# Altium integrated library Altium_WCAP-ATG8 (rev22a).IntLib: 195 symbols (part 2 of 2)
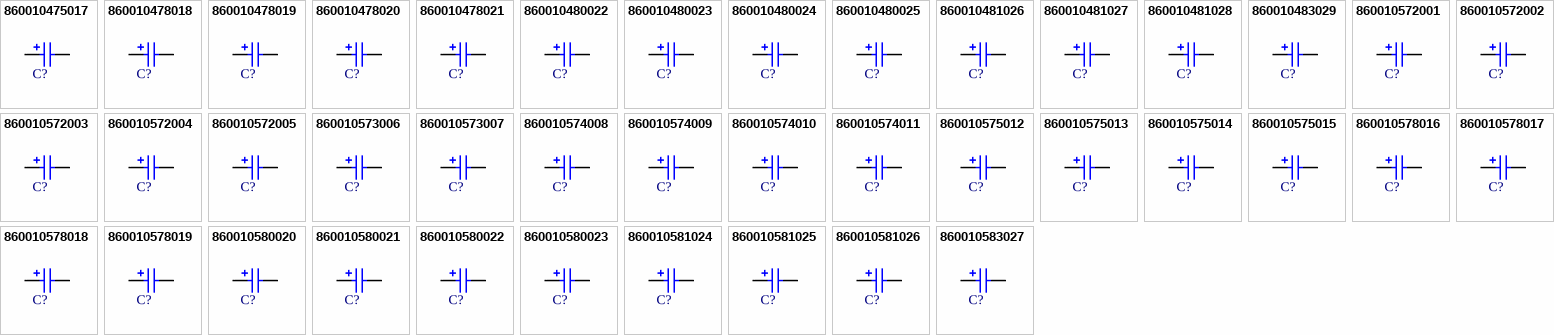
[diagram p5: symbols 860010475017 to 860010583027]

## 860010581024
designator C?, comment 3900uF  (value not drawn)
WCAP-ATG8 Aluminum Electrolytic Capacitor, Radial THT, D18xH31.5mm, 3900uF, 35V; Manufacturer: Wurth Elektronik; Manufacturer Part Number: 860010581024; Capacitance Tolerance: +/-20%; Dissipation Factor: 12%; Endurance: 2000h; Leakage Current: 1365uA; Ripple Current: 2640mA; Technical Reference: ATBL315392M035DSPAEB000; ComponentLink1Description: Manufacturer Link; ComponentLink1URL: https://www.we-online.com/redexpert/article/860010581024?ad; ComponentLink2Description: Datasheet; ComponentLink2URL: https://www.we-online.com/redexpert/spec/860010581024?ad; Category: Aluminum Electrolytic Capacitors; Match Code: WCAP-ATG8; Mount: Through Hole; Operating Temperature Max: 85°C; Operating Temperature Min: -40°C; Packaging: Ammo Pack; Height: 31.5mm; Diameter: 18mm; Capacitance: 3900uF; Rated Voltage (DC): 35V
footprint WCAP-ATG8_D18H31.5
pins: 1 P, 2 N

## 860010581025
designator C?, comment 4700uF  (value not drawn)
WCAP-ATG8 Aluminum Electrolytic Capacitor, Radial THT, D18xH35.5mm, 4700uF, 35V; Manufacturer: Wurth Elektronik; Manufacturer Part Number: 860010581025; Capacitance Tolerance: +/-20%; Dissipation Factor: 12%; Endurance: 2000h; Leakage Current: 1645uA; Ripple Current: 2860mA; Technical Reference: ATBL355472M035DSPAEB000; ComponentLink1Description: Manufacturer Link; ComponentLink1URL: https://www.we-online.com/redexpert/article/860010581025?ad; ComponentLink2Description: Datasheet; ComponentLink2URL: https://www.we-online.com/redexpert/spec/860010581025?ad; Category: Aluminum Electrolytic Capacitors; Match Code: WCAP-ATG8; Mount: Through Hole; Operating Temperature Max: 85°C; Operating Temperature Min: -40°C; Packaging: Ammo Pack; Height: 35.5mm; Diameter: 18mm; Capacitance: 4700uF; Rated Voltage (DC): 35V
footprint WCAP-ATG8_D18H35.5
pins: 1 P, 2 N

## 860010581026
designator C?, comment 5600uF  (value not drawn)
WCAP-ATG8 Aluminum Electrolytic Capacitor, Radial THT, D18xH41mm, 5600uF, 35V; Manufacturer: Wurth Elektronik; Manufacturer Part Number: 860010581026; Capacitance Tolerance: +/-20%; Dissipation Factor: 12%; Endurance: 2000h; Leakage Current: 1960uA; Ripple Current: 2915mA; Technical Reference: ATBL410562M035DSPS1B000; ComponentLink1Description: Manufacturer Link; ComponentLink1URL: https://www.we-online.com/redexpert/article/860010581026?ad; ComponentLink2Description: Datasheet; ComponentLink2URL: https://www.we-online.com/redexpert/spec/860010581026?ad; Category: Aluminum Electrolytic Capacitors; Match Code: WCAP-ATG8; Mount: Through Hole; Operating Temperature Max: 85°C; Operating Temperature Min: -40°C; Packaging: Ammo Pack; Height: 41mm; Diameter: 18mm; Capacitance: 5600uF; Rated Voltage (DC): 35V
footprint WCAP-ATG8_D18H41
pins: 1 P, 2 N

## 860010583027
designator C?, comment 6800uF  (value not drawn)
WCAP-ATG8 Aluminum Electrolytic Capacitor, Radial THT, D22xH41mm, 6800uF, 35V; Manufacturer: Wurth Elektronik; Manufacturer Part Number: 860010583027; Capacitance Tolerance: +/-20%; Dissipation Factor: 12%; Endurance: 2000h; Leakage Current: 2380uA; Ripple Current: 3630mA; Technical Reference: ATBN410682M035DSPS2B000; ComponentLink1Description: Manufacturer Link; ComponentLink1URL: https://www.we-online.com/redexpert/article/860010583027?ad; ComponentLink2Description: Datasheet; ComponentLink2URL: https://www.we-online.com/redexpert/spec/860010583027?ad; Category: Aluminum Electrolytic Capacitors; Match Code: WCAP-ATG8; Mount: Through Hole; Operating Temperature Max: 85°C; Operating Temperature Min: -40°C; Packaging: Ammo Pack; Height: 41mm; Diameter: 22mm; Capacitance: 6800uF; Rated Voltage (DC): 35V
footprint WCAP-ATG8_D22H41
pins: 1 P, 2 N

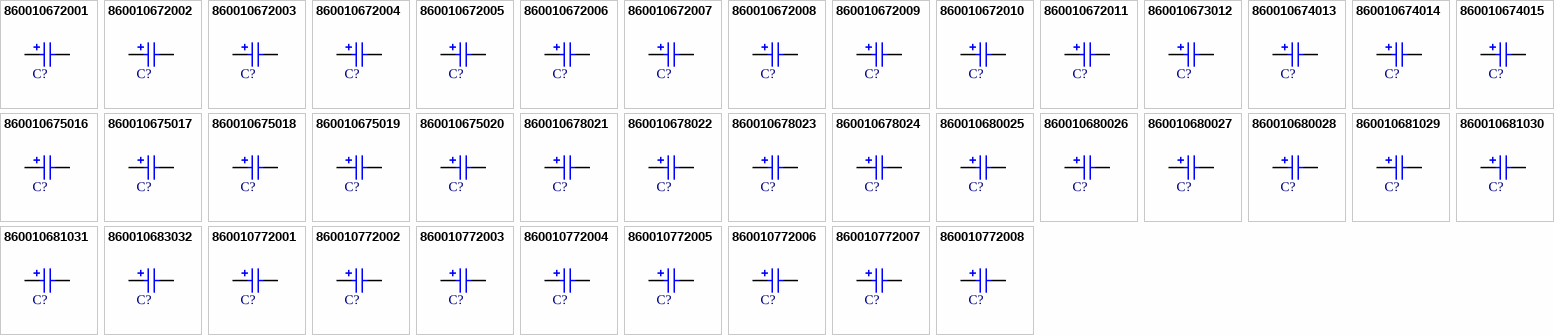
[diagram p3: symbols 860010672001 to 860010772008]

## 860010672001
designator C?, comment 0.1uF  (value not drawn)
WCAP-ATG8 Aluminum Electrolytic Capacitor, Radial THT, D5xH11mm, 0.1uF, 50V; Manufacturer: Wurth Elektronik; Manufacturer Part Number: 860010672001; Capacitance Tolerance: +/-20%; Dissipation Factor: 10%; Endurance: 2000h; Leakage Current: 3uA; Ripple Current: 3.3mA; Technical Reference: ATBC110R10M050DSPA3B000; ComponentLink1Description: Manufacturer Link; ComponentLink1URL: https://www.we-online.com/redexpert/article/860010672001?ad; ComponentLink2Description: Datasheet; ComponentLink2URL: https://www.we-online.com/redexpert/spec/860010672001?ad; Category: Aluminum Electrolytic Capacitors; Match Code: WCAP-ATG8; Mount: Through Hole; Operating Temperature Max: 85°C; Operating Temperature Min: -40°C; Packaging: Ammo Pack; Height: 11mm; Diameter: 5mm; Capacitance: 0.1uF; Rated Voltage (DC): 50V
footprint WCAP-ATG8_D5H11
pins: 1 P, 2 N

## 860010672002
designator C?, comment 0.22uF  (value not drawn)
WCAP-ATG8 Aluminum Electrolytic Capacitor, Radial THT, D5xH11mm, 0.22uF, 50V; Manufacturer: Wurth Elektronik; Manufacturer Part Number: 860010672002; Capacitance Tolerance: +/-20%; Dissipation Factor: 10%; Endurance: 2000h; Leakage Current: 3uA; Ripple Current: 3.3mA; Technical Reference: ATBC110R22M050DSPA3B000; ComponentLink1Description: Manufacturer Link; ComponentLink1URL: https://www.we-online.com/redexpert/article/860010672002?ad; ComponentLink2Description: Datasheet; ComponentLink2URL: https://www.we-online.com/redexpert/spec/860010672002?ad; Category: Aluminum Electrolytic Capacitors; Match Code: WCAP-ATG8; Mount: Through Hole; Operating Temperature Max: 85°C; Operating Temperature Min: -40°C; Packaging: Ammo Pack; Height: 11mm; Diameter: 5mm; Capacitance: 0.22uF; Rated Voltage (DC): 50V
footprint WCAP-ATG8_D5H11
pins: 1 P, 2 N

## 860010672003
designator C?, comment 0.33uF  (value not drawn)
WCAP-ATG8 Aluminum Electrolytic Capacitor, Radial THT, D5xH11mm, 0.33uF, 50V; Manufacturer: Wurth Elektronik; Manufacturer Part Number: 860010672003; Capacitance Tolerance: +/-20%; Dissipation Factor: 10%; Endurance: 2000h; Leakage Current: 3uA; Ripple Current: 5.5mA; Technical Reference: ATBC110R33M050DSPA3B000; ComponentLink1Description: Manufacturer Link; ComponentLink1URL: https://www.we-online.com/redexpert/article/860010672003?ad; ComponentLink2Description: Datasheet; ComponentLink2URL: https://www.we-online.com/redexpert/spec/860010672003?ad; Category: Aluminum Electrolytic Capacitors; Match Code: WCAP-ATG8; Mount: Through Hole; Operating Temperature Max: 85°C; Operating Temperature Min: -40°C; Packaging: Ammo Pack; Height: 11mm; Diameter: 5mm; Capacitance: 0.33uF; Rated Voltage (DC): 50V
footprint WCAP-ATG8_D5H11
pins: 1 P, 2 N

## 860010672004
designator C?, comment 0.47uF  (value not drawn)
WCAP-ATG8 Aluminum Electrolytic Capacitor, Radial THT, D5xH11mm, 0.47uF, 50V; Manufacturer: Wurth Elektronik; Manufacturer Part Number: 860010672004; Capacitance Tolerance: +/-20%; Dissipation Factor: 10%; Endurance: 2000h; Leakage Current: 3uA; Ripple Current: 7.5mA; Technical Reference: ATBC110R47M050DSPA3B000; ComponentLink1Description: Manufacturer Link; ComponentLink1URL: https://www.we-online.com/redexpert/article/860010672004?ad; ComponentLink2Description: Datasheet; ComponentLink2URL: https://www.we-online.com/redexpert/spec/860010672004?ad; Category: Aluminum Electrolytic Capacitors; Match Code: WCAP-ATG8; Mount: Through Hole; Operating Temperature Max: 85°C; Operating Temperature Min: -40°C; Packaging: Ammo Pack; Height: 11mm; Diameter: 5mm; Capacitance: 0.47uF; Rated Voltage (DC): 50V
footprint WCAP-ATG8_D5H11
pins: 1 P, 2 N

## 860010672005
designator C?, comment 1uF  (value not drawn)
WCAP-ATG8 Aluminum Electrolytic Capacitor, Radial THT, D5xH11mm, 1uF, 50V; Manufacturer: Wurth Elektronik; Manufacturer Part Number: 860010672005; Capacitance Tolerance: +/-20%; Dissipation Factor: 10%; Endurance: 2000h; Leakage Current: 3uA; Ripple Current: 17mA; Technical Reference: ATBC110010M050DSPA3B000; ComponentLink1Description: Manufacturer Link; ComponentLink1URL: https://www.we-online.com/redexpert/article/860010672005?ad; ComponentLink2Description: Datasheet; ComponentLink2URL: https://www.we-online.com/redexpert/spec/860010672005?ad; Category: Aluminum Electrolytic Capacitors; Match Code: WCAP-ATG8; Mount: Through Hole; Operating Temperature Max: 85°C; Operating Temperature Min: -40°C; Packaging: Ammo Pack; Height: 11mm; Diameter: 5mm; Capacitance: 1uF; Rated Voltage (DC): 50V
footprint WCAP-ATG8_D5H11
pins: 1 P, 2 N

## 860010672006
designator C?, comment 2.2uF  (value not drawn)
WCAP-ATG8 Aluminum Electrolytic Capacitor, Radial THT, D5xH11mm, 2.2uF, 50V; Manufacturer: Wurth Elektronik; Manufacturer Part Number: 860010672006; Capacitance Tolerance: +/-20%; Dissipation Factor: 10%; Endurance: 2000h; Leakage Current: 3uA; Ripple Current: 28mA; Technical Reference: ATBC1102R2M050DSPA3B000; ComponentLink1Description: Manufacturer Link; ComponentLink1URL: https://www.we-online.com/redexpert/article/860010672006?ad; ComponentLink2Description: Datasheet; ComponentLink2URL: https://www.we-online.com/redexpert/spec/860010672006?ad; Category: Aluminum Electrolytic Capacitors; Match Code: WCAP-ATG8; Mount: Through Hole; Operating Temperature Max: 85°C; Operating Temperature Min: -40°C; Packaging: Ammo Pack; Height: 11mm; Diameter: 5mm; Capacitance: 2.2uF; Rated Voltage (DC): 50V
footprint WCAP-ATG8_D5H11
pins: 1 P, 2 N

## 860010672007
designator C?, comment 3.3uF  (value not drawn)
WCAP-ATG8 Aluminum Electrolytic Capacitor, Radial THT, D5xH11mm, 3.3uF, 50V; Manufacturer: Wurth Elektronik; Manufacturer Part Number: 860010672007; Capacitance Tolerance: +/-20%; Dissipation Factor: 10%; Endurance: 2000h; Leakage Current: 3uA; Ripple Current: 39mA; Technical Reference: ATBC1103R3M050DSPA3B000; ComponentLink1Description: Manufacturer Link; ComponentLink1URL: https://www.we-online.com/redexpert/article/860010672007?ad; ComponentLink2Description: Datasheet; ComponentLink2URL: https://www.we-online.com/redexpert/spec/860010672007?ad; Category: Aluminum Electrolytic Capacitors; Match Code: WCAP-ATG8; Mount: Through Hole; Operating Temperature Max: 85°C; Operating Temperature Min: -40°C; Packaging: Ammo Pack; Height: 11mm; Diameter: 5mm; Capacitance: 3.3uF; Rated Voltage (DC): 50V
footprint WCAP-ATG8_D5H11
pins: 1 P, 2 N

## 860010672008
designator C?, comment 4.7uF  (value not drawn)
WCAP-ATG8 Aluminum Electrolytic Capacitor, Radial THT, D5xH11mm, 4.7uF, 50V; Manufacturer: Wurth Elektronik; Manufacturer Part Number: 860010672008; Capacitance Tolerance: +/-20%; Dissipation Factor: 10%; Endurance: 2000h; Leakage Current: 3uA; Ripple Current: 46mA; Technical Reference: ATBC1104R7M050DSPA3B000; ComponentLink1Description: Manufacturer Link; ComponentLink1URL: https://www.we-online.com/redexpert/article/860010672008?ad; ComponentLink2Description: Datasheet; ComponentLink2URL: https://www.we-online.com/redexpert/spec/860010672008?ad; Category: Aluminum Electrolytic Capacitors; Match Code: WCAP-ATG8; Mount: Through Hole; Operating Temperature Max: 85°C; Operating Temperature Min: -40°C; Packaging: Ammo Pack; Height: 11mm; Diameter: 5mm; Capacitance: 4.7uF; Rated Voltage (DC): 50V
footprint WCAP-ATG8_D5H11
pins: 1 P, 2 N

## 860010672009
designator C?, comment 10uF  (value not drawn)
WCAP-ATG8 Aluminum Electrolytic Capacitor, Radial THT, D5xH11mm, 10uF, 50V; Manufacturer: Wurth Elektronik; Manufacturer Part Number: 860010672009; Capacitance Tolerance: +/-20%; Dissipation Factor: 10%; Endurance: 2000h; Leakage Current: 5uA; Ripple Current: 72mA; Technical Reference: ATBC110100M050DSPA3B000; ComponentLink1Description: Manufacturer Link; ComponentLink1URL: https://www.we-online.com/redexpert/article/860010672009?ad; ComponentLink2Description: Datasheet; ComponentLink2URL: https://www.we-online.com/redexpert/spec/860010672009?ad; Category: Aluminum Electrolytic Capacitors; Match Code: WCAP-ATG8; Mount: Through Hole; Operating Temperature Max: 85°C; Operating Temperature Min: -40°C; Packaging: Ammo Pack; Height: 11mm; Diameter: 5mm; Capacitance: 10uF; Rated Voltage (DC): 50V
footprint WCAP-ATG8_D5H11
pins: 1 P, 2 N

## 860010672010
designator C?, comment 22uF  (value not drawn)
WCAP-ATG8 Aluminum Electrolytic Capacitor, Radial THT, D5xH11mm, 22uF, 50V; Manufacturer: Wurth Elektronik; Manufacturer Part Number: 860010672010; Capacitance Tolerance: +/-20%; Dissipation Factor: 10%; Endurance: 2000h; Leakage Current: 11uA; Ripple Current: 110mA; Technical Reference: ATBC110220M050DSPA3B000; ComponentLink1Description: Manufacturer Link; ComponentLink1URL: https://www.we-online.com/redexpert/article/860010672010?ad; ComponentLink2Description: Datasheet; ComponentLink2URL: https://www.we-online.com/redexpert/spec/860010672010?ad; Category: Aluminum Electrolytic Capacitors; Match Code: WCAP-ATG8; Mount: Through Hole; Operating Temperature Max: 85°C; Operating Temperature Min: -40°C; Packaging: Ammo Pack; Height: 11mm; Diameter: 5mm; Capacitance: 22uF; Rated Voltage (DC): 50V
footprint WCAP-ATG8_D5H11
pins: 1 P, 2 N

## 860010672011
designator C?, comment 33uF  (value not drawn)
WCAP-ATG8 Aluminum Electrolytic Capacitor, Radial THT, D5xH11mm, 33uF, 50V; Manufacturer: Wurth Elektronik; Manufacturer Part Number: 860010672011; Capacitance Tolerance: +/-20%; Dissipation Factor: 10%; Endurance: 2000h; Leakage Current: 16.5uA; Ripple Current: 132mA; Technical Reference: ATBC110330M050DSPA3B000; ComponentLink1Description: Manufacturer Link; ComponentLink1URL: https://www.we-online.com/redexpert/article/860010672011?ad; ComponentLink2Description: Datasheet; ComponentLink2URL: https://www.we-online.com/redexpert/spec/860010672011?ad; Category: Aluminum Electrolytic Capacitors; Match Code: WCAP-ATG8; Mount: Through Hole; Operating Temperature Max: 85°C; Operating Temperature Min: -40°C; Packaging: Ammo Pack; Height: 11mm; Diameter: 5mm; Capacitance: 33uF; Rated Voltage (DC): 50V
footprint WCAP-ATG8_D5H11
pins: 1 P, 2 N

## 860010673012
designator C?, comment 47uF  (value not drawn)
WCAP-ATG8 Aluminum Electrolytic Capacitor, Radial THT, D6.3xH11mm, 47uF, 50V; Manufacturer: Wurth Elektronik; Manufacturer Part Number: 860010673012; Capacitance Tolerance: +/-20%; Dissipation Factor: 10%; Endurance: 2000h; Leakage Current: 23.5uA; Ripple Current: 165mA; Technical Reference: ATBD110470M050DSPA4B000; ComponentLink1Description: Manufacturer Link; ComponentLink1URL: https://www.we-online.com/redexpert/article/860010673012?ad; ComponentLink2Description: Datasheet; ComponentLink2URL: https://www.we-online.com/redexpert/spec/860010673012?ad; Category: Aluminum Electrolytic Capacitors; Match Code: WCAP-ATG8; Mount: Through Hole; Operating Temperature Max: 85°C; Operating Temperature Min: -40°C; Packaging: Ammo Pack; Height: 11mm; Diameter: 6.3mm; Capacitance: 47uF; Rated Voltage (DC): 50V
footprint WCAP-ATG8_D6.3H11
pins: 1 P, 2 N

## 860010674013
designator C?, comment 68uF  (value not drawn)
WCAP-ATG8 Aluminum Electrolytic Capacitor, Radial THT, D8xH11.5mm, 68uF, 50V; Manufacturer: Wurth Elektronik; Manufacturer Part Number: 860010674013; Capacitance Tolerance: +/-20%; Dissipation Factor: 10%; Endurance: 2000h; Leakage Current: 34uA; Ripple Current: 220mA; Technical Reference: ATBE115680M050DSPA7B000; ComponentLink1Description: Manufacturer Link; ComponentLink1URL: https://www.we-online.com/redexpert/article/860010674013?ad; ComponentLink2Description: Datasheet; ComponentLink2URL: https://www.we-online.com/redexpert/spec/860010674013?ad; Category: Aluminum Electrolytic Capacitors; Match Code: WCAP-ATG8; Mount: Through Hole; Operating Temperature Max: 85°C; Operating Temperature Min: -40°C; Packaging: Ammo Pack; Height: 11.5mm; Diameter: 8mm; Capacitance: 68uF; Rated Voltage (DC): 50V
footprint WCAP-ATG8_D8H11.5
pins: 1 P, 2 N

## 860010674014
designator C?, comment 100uF  (value not drawn)
WCAP-ATG8 Aluminum Electrolytic Capacitor, Radial THT, D8xH11.5mm, 100uF, 50V; Manufacturer: Wurth Elektronik; Manufacturer Part Number: 860010674014; Capacitance Tolerance: +/-20%; Dissipation Factor: 10%; Endurance: 2000h; Leakage Current: 50uA; Ripple Current: 286mA; Technical Reference: ATBE115101M050DSPA7B000; ComponentLink1Description: Manufacturer Link; ComponentLink1URL: https://www.we-online.com/redexpert/article/860010674014?ad; ComponentLink2Description: Datasheet; ComponentLink2URL: https://www.we-online.com/redexpert/spec/860010674014?ad; Category: Aluminum Electrolytic Capacitors; Match Code: WCAP-ATG8; Mount: Through Hole; Operating Temperature Max: 85°C; Operating Temperature Min: -40°C; Packaging: Ammo Pack; Height: 11.5mm; Diameter: 8mm; Capacitance: 100uF; Rated Voltage (DC): 50V
footprint WCAP-ATG8_D8H11.5
pins: 1 P, 2 N

## 860010674015
designator C?, comment 120uF  (value not drawn)
WCAP-ATG8 Aluminum Electrolytic Capacitor, Radial THT, D8xH11.5mm, 120uF, 50V; Manufacturer: Wurth Elektronik; Manufacturer Part Number: 860010674015; Capacitance Tolerance: +/-20%; Dissipation Factor: 10%; Endurance: 2000h; Leakage Current: 60uA; Ripple Current: 319mA; Technical Reference: ATBE115121M050DSPA7B000; ComponentLink1Description: Manufacturer Link; ComponentLink1URL: https://www.we-online.com/redexpert/article/860010674015?ad; ComponentLink2Description: Datasheet; ComponentLink2URL: https://www.we-online.com/redexpert/spec/860010674015?ad; Category: Aluminum Electrolytic Capacitors; Match Code: WCAP-ATG8; Mount: Through Hole; Operating Temperature Max: 85°C; Operating Temperature Min: -40°C; Packaging: Ammo Pack; Height: 11.5mm; Diameter: 8mm; Capacitance: 120uF; Rated Voltage (DC): 50V
footprint WCAP-ATG8_D8H11.5
pins: 1 P, 2 N

## 860010675016
designator C?, comment 150uF  (value not drawn)
WCAP-ATG8 Aluminum Electrolytic Capacitor, Radial THT, D10xH12.5mm, 150uF, 50V; Manufacturer: Wurth Elektronik; Manufacturer Part Number: 860010675016; Capacitance Tolerance: +/-20%; Dissipation Factor: 10%; Endurance: 2000h; Leakage Current: 75uA; Ripple Current: 363mA; Technical Reference: ATBF125151M050DSPA9B000; ComponentLink1Description: Manufacturer Link; ComponentLink1URL: https://www.we-online.com/redexpert/article/860010675016?ad; ComponentLink2Description: Datasheet; ComponentLink2URL: https://www.we-online.com/redexpert/spec/860010675016?ad; Category: Aluminum Electrolytic Capacitors; Match Code: WCAP-ATG8; Mount: Through Hole; Operating Temperature Max: 85°C; Operating Temperature Min: -40°C; Packaging: Ammo Pack; Height: 12.5mm; Diameter: 10mm; Capacitance: 150uF; Rated Voltage (DC): 50V
footprint WCAP-ATG8_D10H12.5
pins: 1 P, 2 N

## 860010675017
designator C?, comment 180uF  (value not drawn)
WCAP-ATG8 Aluminum Electrolytic Capacitor, Radial THT, D10xH12.5mm, 180uF, 50V; Manufacturer: Wurth Elektronik; Manufacturer Part Number: 860010675017; Capacitance Tolerance: +/-20%; Dissipation Factor: 10%; Endurance: 2000h; Leakage Current: 90uA; Ripple Current: 418mA; Technical Reference: ATBF125181M050DSPA9B000; ComponentLink1Description: Manufacturer Link; ComponentLink1URL: https://www.we-online.com/redexpert/article/860010675017?ad; ComponentLink2Description: Datasheet; ComponentLink2URL: https://www.we-online.com/redexpert/spec/860010675017?ad; Category: Aluminum Electrolytic Capacitors; Match Code: WCAP-ATG8; Mount: Through Hole; Operating Temperature Max: 85°C; Operating Temperature Min: -40°C; Packaging: Ammo Pack; Height: 12.5mm; Diameter: 10mm; Capacitance: 180uF; Rated Voltage (DC): 50V
footprint WCAP-ATG8_D10H12.5
pins: 1 P, 2 N

## 860010675018
designator C?, comment 220uF  (value not drawn)
WCAP-ATG8 Aluminum Electrolytic Capacitor, Radial THT, D10xH12.5mm, 220uF, 50V; Manufacturer: Wurth Elektronik; Manufacturer Part Number: 860010675018; Capacitance Tolerance: +/-20%; Dissipation Factor: 10%; Endurance: 2000h; Leakage Current: 110uA; Ripple Current: 468mA; Technical Reference: ATBF125221M050DSPA9B000; ComponentLink1Description: Manufacturer Link; ComponentLink1URL: https://www.we-online.com/redexpert/article/860010675018?ad; ComponentLink2Description: Datasheet; ComponentLink2URL: https://www.we-online.com/redexpert/spec/860010675018?ad; Category: Aluminum Electrolytic Capacitors; Match Code: WCAP-ATG8; Mount: Through Hole; Operating Temperature Max: 85°C; Operating Temperature Min: -40°C; Packaging: Ammo Pack; Height: 12.5mm; Diameter: 10mm; Capacitance: 220uF; Rated Voltage (DC): 50V
footprint WCAP-ATG8_D10H12.5
pins: 1 P, 2 N

## 860010675019
designator C?, comment 330uF  (value not drawn)
WCAP-ATG8 Aluminum Electrolytic Capacitor, Radial THT, D10xH16mm, 330uF, 50V; Manufacturer: Wurth Elektronik; Manufacturer Part Number: 860010675019; Capacitance Tolerance: +/-20%; Dissipation Factor: 10%; Endurance: 2000h; Leakage Current: 165uA; Ripple Current: 649mA; Technical Reference: ATBF160331M050DSPAAB000; ComponentLink1Description: Manufacturer Link; ComponentLink1URL: https://www.we-online.com/redexpert/article/860010675019?ad; ComponentLink2Description: Datasheet; ComponentLink2URL: https://www.we-online.com/redexpert/spec/860010675019?ad; Category: Aluminum Electrolytic Capacitors; Match Code: WCAP-ATG8; Mount: Through Hole; Operating Temperature Max: 85°C; Operating Temperature Min: -40°C; Packaging: Ammo Pack; Height: 16mm; Diameter: 10mm; Capacitance: 330uF; Rated Voltage (DC): 50V
footprint WCAP-ATG8_D10H16
pins: 1 P, 2 N

## 860010675020
designator C?, comment 470uF  (value not drawn)
WCAP-ATG8 Aluminum Electrolytic Capacitor, Radial THT, D10xH20mm, 470uF, 50V; Manufacturer: Wurth Elektronik; Manufacturer Part Number: 860010675020; Capacitance Tolerance: +/-20%; Dissipation Factor: 10%; Endurance: 2000h; Leakage Current: 235uA; Ripple Current: 828mA; Technical Reference: ATBF200471M050DSPAAB000; ComponentLink1Description: Manufacturer Link; ComponentLink1URL: https://www.we-online.com/redexpert/article/860010675020?ad; ComponentLink2Description: Datasheet; ComponentLink2URL: https://www.we-online.com/redexpert/spec/860010675020?ad; Category: Aluminum Electrolytic Capacitors; Match Code: WCAP-ATG8; Mount: Through Hole; Operating Temperature Max: 85°C; Operating Temperature Min: -40°C; Packaging: Ammo Pack; Height: 20mm; Diameter: 10mm; Capacitance: 470uF; Rated Voltage (DC): 50V
footprint WCAP-ATG8_D10H20
pins: 1 P, 2 N

## 860010678021
designator C?, comment 560uF  (value not drawn)
WCAP-ATG8 Aluminum Electrolytic Capacitor, Radial THT, D13xH20mm, 560uF, 50V; Manufacturer: Wurth Elektronik; Manufacturer Part Number: 860010678021; Capacitance Tolerance: +/-20%; Dissipation Factor: 10%; Endurance: 2000h; Leakage Current: 280uA; Ripple Current: 902mA; Technical Reference: ATBI200561M050DSPACB000; ComponentLink1Description: Manufacturer Link; ComponentLink1URL: https://www.we-online.com/redexpert/article/860010678021?ad; ComponentLink2Description: Datasheet; ComponentLink2URL: https://www.we-online.com/redexpert/spec/860010678021?ad; Category: Aluminum Electrolytic Capacitors; Match Code: WCAP-ATG8; Mount: Through Hole; Operating Temperature Max: 85°C; Operating Temperature Min: -40°C; Packaging: Ammo Pack; Height: 20mm; Diameter: 13mm; Capacitance: 560uF; Rated Voltage (DC): 50V
footprint WCAP-ATG8_D13H20
pins: 1 P, 2 N

## 860010678022
designator C?, comment 680uF  (value not drawn)
WCAP-ATG8 Aluminum Electrolytic Capacitor, Radial THT, D13xH20mm, 680uF, 50V; Manufacturer: Wurth Elektronik; Manufacturer Part Number: 860010678022; Capacitance Tolerance: +/-20%; Dissipation Factor: 10%; Endurance: 2000h; Leakage Current: 340uA; Ripple Current: 1056mA; Technical Reference: ATBI200681M050DSPACB000; ComponentLink1Description: Manufacturer Link; ComponentLink1URL: https://www.we-online.com/redexpert/article/860010678022?ad; ComponentLink2Description: Datasheet; ComponentLink2URL: https://www.we-online.com/redexpert/spec/860010678022?ad; Category: Aluminum Electrolytic Capacitors; Match Code: WCAP-ATG8; Mount: Through Hole; Operating Temperature Max: 85°C; Operating Temperature Min: -40°C; Packaging: Ammo Pack; Height: 20mm; Diameter: 13mm; Capacitance: 680uF; Rated Voltage (DC): 50V
footprint WCAP-ATG8_D13H20
pins: 1 P, 2 N

## 860010678023
designator C?, comment 820uF  (value not drawn)
WCAP-ATG8 Aluminum Electrolytic Capacitor, Radial THT, D13xH25mm, 820uF, 50V; Manufacturer: Wurth Elektronik; Manufacturer Part Number: 860010678023; Capacitance Tolerance: +/-20%; Dissipation Factor: 10%; Endurance: 2000h; Leakage Current: 410uA; Ripple Current: 1287mA; Technical Reference: ATBI250821M050DSPACB000; ComponentLink1Description: Manufacturer Link; ComponentLink1URL: https://www.we-online.com/redexpert/article/860010678023?ad; ComponentLink2Description: Datasheet; ComponentLink2URL: https://www.we-online.com/redexpert/spec/860010678023?ad; Category: Aluminum Electrolytic Capacitors; Match Code: WCAP-ATG8; Mount: Through Hole; Operating Temperature Max: 85°C; Operating Temperature Min: -40°C; Packaging: Ammo Pack; Height: 25mm; Diameter: 13mm; Capacitance: 820uF; Rated Voltage (DC): 50V
footprint WCAP-ATG8_D13H25
pins: 1 P, 2 N

## 860010678024
designator C?, comment 1000uF  (value not drawn)
WCAP-ATG8 Aluminum Electrolytic Capacitor, Radial THT, D13xH25mm, 1000uF, 50V; Manufacturer: Wurth Elektronik; Manufacturer Part Number: 860010678024; Capacitance Tolerance: +/-20%; Dissipation Factor: 10%; Endurance: 2000h; Leakage Current: 500uA; Ripple Current: 1485mA; Technical Reference: ATBI250102M050DSPACB000; ComponentLink1Description: Manufacturer Link; ComponentLink1URL: https://www.we-online.com/redexpert/article/860010678024?ad; ComponentLink2Description: Datasheet; ComponentLink2URL: https://www.we-online.com/redexpert/spec/860010678024?ad; Category: Aluminum Electrolytic Capacitors; Match Code: WCAP-ATG8; Mount: Through Hole; Operating Temperature Max: 85°C; Operating Temperature Min: -40°C; Packaging: Ammo Pack; Height: 25mm; Diameter: 13mm; Capacitance: 1000uF; Rated Voltage (DC): 50V
footprint WCAP-ATG8_D13H25
pins: 1 P, 2 N

## 860010680025
designator C?, comment 1200uF  (value not drawn)
WCAP-ATG8 Aluminum Electrolytic Capacitor, Radial THT, D16xH25mm, 1200uF, 50V; Manufacturer: Wurth Elektronik; Manufacturer Part Number: 860010680025; Capacitance Tolerance: +/-20%; Dissipation Factor: 10%; Endurance: 2000h; Leakage Current: 600uA; Ripple Current: 1617mA; Technical Reference: ATBK250122M050DSPAEB000; ComponentLink1Description: Manufacturer Link; ComponentLink1URL: https://www.we-online.com/redexpert/article/860010680025?ad; ComponentLink2Description: Datasheet; ComponentLink2URL: https://www.we-online.com/redexpert/spec/860010680025?ad; Category: Aluminum Electrolytic Capacitors; Match Code: WCAP-ATG8; Mount: Through Hole; Operating Temperature Max: 85°C; Operating Temperature Min: -40°C; Packaging: Ammo Pack; Height: 25mm; Diameter: 16mm; Capacitance: 1200uF; Rated Voltage (DC): 50V
footprint WCAP-ATG8_D16H25
pins: 1 P, 2 N

## 860010680026
designator C?, comment 1500uF  (value not drawn)
WCAP-ATG8 Aluminum Electrolytic Capacitor, Radial THT, D16xH31.5mm, 1500uF, 50V; Manufacturer: Wurth Elektronik; Manufacturer Part Number: 860010680026; Capacitance Tolerance: +/-20%; Dissipation Factor: 10%; Endurance: 2000h; Leakage Current: 750uA; Ripple Current: 1848mA; Technical Reference: ATBK315152M050DSPADB000; ComponentLink1Description: Manufacturer Link; ComponentLink1URL: https://www.we-online.com/redexpert/article/860010680026?ad; ComponentLink2Description: Datasheet; ComponentLink2URL: https://www.we-online.com/redexpert/spec/860010680026?ad; Category: Aluminum Electrolytic Capacitors; Match Code: WCAP-ATG8; Mount: Through Hole; Operating Temperature Max: 85°C; Operating Temperature Min: -40°C; Packaging: Ammo Pack; Height: 31.5mm; Diameter: 16mm; Capacitance: 1500uF; Rated Voltage (DC): 50V
footprint WCAP-ATG8_D16H31.5
pins: 1 P, 2 N

## 860010680027
designator C?, comment 1800uF  (value not drawn)
WCAP-ATG8 Aluminum Electrolytic Capacitor, Radial THT, D16xH31.5mm, 1800uF, 50V; Manufacturer: Wurth Elektronik; Manufacturer Part Number: 860010680027; Capacitance Tolerance: +/-20%; Dissipation Factor: 10%; Endurance: 2000h; Leakage Current: 900uA; Ripple Current: 2112mA; Technical Reference: ATBK315182M050DSPADB000; ComponentLink1Description: Manufacturer Link; ComponentLink1URL: https://www.we-online.com/redexpert/article/860010680027?ad; ComponentLink2Description: Datasheet; ComponentLink2URL: https://www.we-online.com/redexpert/spec/860010680027?ad; Category: Aluminum Electrolytic Capacitors; Match Code: WCAP-ATG8; Mount: Through Hole; Operating Temperature Max: 85°C; Operating Temperature Min: -40°C; Packaging: Ammo Pack; Height: 31.5mm; Diameter: 16mm; Capacitance: 1800uF; Rated Voltage (DC): 50V
footprint WCAP-ATG8_D16H31.5
pins: 1 P, 2 N

## 860010680028
designator C?, comment 2200uF  (value not drawn)
WCAP-ATG8 Aluminum Electrolytic Capacitor, Radial THT, D16xH35.5mm, 2200uF, 50V; Manufacturer: Wurth Elektronik; Manufacturer Part Number: 860010680028; Capacitance Tolerance: +/-20%; Dissipation Factor: 10%; Endurance: 2000h; Leakage Current: 1100uA; Ripple Current: 2310mA; Technical Reference: ATBK355222M050DSPADB000; ComponentLink1Description: Manufacturer Link; ComponentLink1URL: https://www.we-online.com/redexpert/article/860010680028?ad; ComponentLink2Description: Datasheet; ComponentLink2URL: https://www.we-online.com/redexpert/spec/860010680028?ad; Category: Aluminum Electrolytic Capacitors; Match Code: WCAP-ATG8; Mount: Through Hole; Operating Temperature Max: 85°C; Operating Temperature Min: -40°C; Packaging: Ammo Pack; Height: 35.5mm; Diameter: 16mm; Capacitance: 2200uF; Rated Voltage (DC): 50V
footprint WCAP-ATG8_D16H35.5
pins: 1 P, 2 N

## 860010681029
designator C?, comment 2700uF  (value not drawn)
WCAP-ATG8 Aluminum Electrolytic Capacitor, Radial THT, D18xH31.5mm, 2700uF, 50V; Manufacturer: Wurth Elektronik; Manufacturer Part Number: 860010681029; Capacitance Tolerance: +/-20%; Dissipation Factor: 10%; Endurance: 2000h; Leakage Current: 1350uA; Ripple Current: 2420mA; Technical Reference: ATBL315272M050DSPAEB000; ComponentLink1Description: Manufacturer Link; ComponentLink1URL: https://www.we-online.com/redexpert/article/860010681029?ad; ComponentLink2Description: Datasheet; ComponentLink2URL: https://www.we-online.com/redexpert/spec/860010681029?ad; Category: Aluminum Electrolytic Capacitors; Match Code: WCAP-ATG8; Mount: Through Hole; Operating Temperature Max: 85°C; Operating Temperature Min: -40°C; Packaging: Ammo Pack; Height: 31.5mm; Diameter: 18mm; Capacitance: 2700uF; Rated Voltage (DC): 50V
footprint WCAP-ATG8_D18H31.5
pins: 1 P, 2 N

## 860010681030
designator C?, comment 3300uF  (value not drawn)
WCAP-ATG8 Aluminum Electrolytic Capacitor, Radial THT, D18xH35.5mm, 3300uF, 50V; Manufacturer: Wurth Elektronik; Manufacturer Part Number: 860010681030; Capacitance Tolerance: +/-20%; Dissipation Factor: 10%; Endurance: 2000h; Leakage Current: 1650uA; Ripple Current: 2750mA; Technical Reference: ATBL355332M050DSPAEB000; ComponentLink1Description: Manufacturer Link; ComponentLink1URL: https://www.we-online.com/redexpert/article/860010681030?ad; ComponentLink2Description: Datasheet; ComponentLink2URL: https://www.we-online.com/redexpert/spec/860010681030?ad; Category: Aluminum Electrolytic Capacitors; Match Code: WCAP-ATG8; Mount: Through Hole; Operating Temperature Max: 85°C; Operating Temperature Min: -40°C; Packaging: Ammo Pack; Height: 35.5mm; Diameter: 18mm; Capacitance: 3300uF; Rated Voltage (DC): 50V
footprint WCAP-ATG8_D18H35.5
pins: 1 P, 2 N

## 860010681031
designator C?, comment 3900uF  (value not drawn)
WCAP-ATG8 Aluminum Electrolytic Capacitor, Radial THT, D18xH41mm, 3900uF, 50V; Manufacturer: Wurth Elektronik; Manufacturer Part Number: 860010681031; Capacitance Tolerance: +/-20%; Dissipation Factor: 10%; Endurance: 2000h; Leakage Current: 1950uA; Ripple Current: 2871mA; Technical Reference: ATBL410392M050DSPS1B000; ComponentLink1Description: Manufacturer Link; ComponentLink1URL: https://www.we-online.com/redexpert/article/860010681031?ad; ComponentLink2Description: Datasheet; ComponentLink2URL: https://www.we-online.com/redexpert/spec/860010681031?ad; Category: Aluminum Electrolytic Capacitors; Match Code: WCAP-ATG8; Mount: Through Hole; Operating Temperature Max: 85°C; Operating Temperature Min: -40°C; Packaging: Ammo Pack; Height: 41mm; Diameter: 18mm; Capacitance: 3900uF; Rated Voltage (DC): 50V
footprint WCAP-ATG8_D18H41
pins: 1 P, 2 N

## 860010683032
designator C?, comment 4700uF  (value not drawn)
WCAP-ATG8 Aluminum Electrolytic Capacitor, Radial THT, D22xH41mm, 4700uF, 50V; Manufacturer: Wurth Elektronik; Manufacturer Part Number: 860010683032; Capacitance Tolerance: +/-20%; Dissipation Factor: 10%; Endurance: 2000h; Leakage Current: 2350uA; Ripple Current: 3355mA; Technical Reference: ATBN410472M050DSPS2B000; ComponentLink1Description: Manufacturer Link; ComponentLink1URL: https://www.we-online.com/redexpert/article/860010683032?ad; ComponentLink2Description: Datasheet; ComponentLink2URL: https://www.we-online.com/redexpert/spec/860010683032?ad; Category: Aluminum Electrolytic Capacitors; Match Code: WCAP-ATG8; Mount: Through Hole; Operating Temperature Max: 85°C; Operating Temperature Min: -40°C; Packaging: Ammo Pack; Height: 41mm; Diameter: 22mm; Capacitance: 4700uF; Rated Voltage (DC): 50V
footprint WCAP-ATG8_D22H41
pins: 1 P, 2 N

## 860010772001
designator C?, comment 0.1uF  (value not drawn)
WCAP-ATG8 Aluminum Electrolytic Capacitor, Radial THT, D5xH11mm, 0.1uF, 63V; Manufacturer: Wurth Elektronik; Manufacturer Part Number: 860010772001; Capacitance Tolerance: +/-20%; Dissipation Factor: 9%; Endurance: 2000h; Leakage Current: 3uA; Ripple Current: 4mA; Technical Reference: ATBC110R10M063DSPA3B000; ComponentLink1Description: Manufacturer Link; ComponentLink1URL: https://www.we-online.com/redexpert/article/860010772001?ad; ComponentLink2Description: Datasheet; ComponentLink2URL: https://www.we-online.com/redexpert/spec/860010772001?ad; Category: Aluminum Electrolytic Capacitors; Match Code: WCAP-ATG8; Mount: Through Hole; Operating Temperature Max: 85°C; Operating Temperature Min: -40°C; Packaging: Ammo Pack; Height: 11mm; Diameter: 5mm; Capacitance: 0.1uF; Rated Voltage (DC): 63V
footprint WCAP-ATG8_D5H11
pins: 1 P, 2 N

## 860010772002
designator C?, comment 0.22uF  (value not drawn)
WCAP-ATG8 Aluminum Electrolytic Capacitor, Radial THT, D5xH11mm, 0.22uF, 63V; Manufacturer: Wurth Elektronik; Manufacturer Part Number: 860010772002; Capacitance Tolerance: +/-20%; Dissipation Factor: 9%; Endurance: 2000h; Leakage Current: 3uA; Ripple Current: 4mA; Technical Reference: ATBC110R22M063DSPA3B000; ComponentLink1Description: Manufacturer Link; ComponentLink1URL: https://www.we-online.com/redexpert/article/860010772002?ad; ComponentLink2Description: Datasheet; ComponentLink2URL: https://www.we-online.com/redexpert/spec/860010772002?ad; Category: Aluminum Electrolytic Capacitors; Match Code: WCAP-ATG8; Mount: Through Hole; Operating Temperature Max: 85°C; Operating Temperature Min: -40°C; Packaging: Ammo Pack; Height: 11mm; Diameter: 5mm; Capacitance: 0.22uF; Rated Voltage (DC): 63V
footprint WCAP-ATG8_D5H11
pins: 1 P, 2 N
